# Altium integrated library WCAP-ATET_rev15a.intlib: 72 symbols (continued)
## WCAP-ATET 6.3x11x2.5x0.5 860130673002
designator C?, comment 22 μF
WCAP-ATET Aluminum Electrolytic Capacitors , 22 μF; + / - 20%; 50 V , 6,3 x 11; Manufacturer: Wurth Elektronik; partNo: 860130673002; E-mail: libraries@we-online.com; Characteristics: Aluminum Electrolytic Capacitor; Recommended soldering: Wave; Operating temperature:–40 °C to +125 °C for UR < 250 V, –25 °C to +125 °C for UR ≥ 250 V; High temperature product series; Load life: 1000–2000 h @ +125 °C; ComponentLink1Description: Manufacturer; ComponentLink1URL: http://www.we-online.com; ComponentLink2Description: Datasheet; ComponentLink2URL: http://katalog.we-online.de/pbs/datasheet/860130673002.pdf; Created by: Karrer Zheng; Created Date: 6/8/2015; Capacitance: 22 μF; Application: Used in circuit with rigorous conditions and high ambient temperature;  high voltage type range from 160V-450V used as primary side input filter in power supply. Low voltage type is applied to the secondary side output filtering loop, used in switching power supply with higher operating temperature, DC-DC converter, AC-DC converter, adapter, charger, TV, VCR, DC motor circuit filter, high-end switching power supply, LCD TV, energy saving lamps, electronic ballast, LED lamp and etc.
footprint WCAP-ATET 6.3x11x2.5x0.5
pins: 1, 2

## WCAP-ATET 8x11.5x3.5x0.5 860130674003
designator C?, comment 33 μF
WCAP-ATET Aluminum Electrolytic Capacitors , 33 μF; + / - 20%; 50 V , 8 x 11,5; Manufacturer: Wurth Elektronik; partNo: 860130674003; E-mail: libraries@we-online.com; Characteristics: Aluminum Electrolytic Capacitor; Recommended soldering: Wave; Operating temperature:–40 °C to +125 °C for UR < 250 V, –25 °C to +125 °C for UR ≥ 250 V; High temperature product series; Load life: 1000–2000 h @ +125 °C; ComponentLink1Description: Manufacturer; ComponentLink1URL: http://www.we-online.com; ComponentLink2Description: Datasheet; ComponentLink2URL: http://katalog.we-online.de/pbs/datasheet/860130674003.pdf; Created by: Karrer Zheng; Created Date: 6/8/2015; Capacitance: 33 μF; Application: Used in circuit with rigorous conditions and high ambient temperature;  high voltage type range from 160V-450V used as primary side input filter in power supply. Low voltage type is applied to the secondary side output filtering loop, used in switching power supply with higher operating temperature, DC-DC converter, AC-DC converter, adapter, charger, TV, VCR, DC motor circuit filter, high-end switching power supply, LCD TV, energy saving lamps, electronic ballast, LED lamp and etc.
footprint WCAP-ATET 8x11.5x3.5x0.5
pins: 1, 2

## WCAP-ATET 8x11.5x3.5x0.5 860130674004
designator C?, comment 47 μF
WCAP-ATET Aluminum Electrolytic Capacitors , 47 μF; + / - 20%; 50 V , 8 x 11,5; Manufacturer: Wurth Elektronik; partNo: 860130674004; E-mail: libraries@we-online.com; Characteristics: Aluminum Electrolytic Capacitor; Recommended soldering: Wave; Operating temperature:–40 °C to +125 °C for UR < 250 V, –25 °C to +125 °C for UR ≥ 250 V; High temperature product series; Load life: 1000–2000 h @ +125 °C; ComponentLink1Description: Manufacturer; ComponentLink1URL: http://www.we-online.com; ComponentLink2Description: Datasheet; ComponentLink2URL: http://katalog.we-online.de/pbs/datasheet/860130674004.pdf; Created by: Karrer Zheng; Created Date: 6/8/2015; Capacitance: 47 μF; Application: Used in circuit with rigorous conditions and high ambient temperature;  high voltage type range from 160V-450V used as primary side input filter in power supply. Low voltage type is applied to the secondary side output filtering loop, used in switching power supply with higher operating temperature, DC-DC converter, AC-DC converter, adapter, charger, TV, VCR, DC motor circuit filter, high-end switching power supply, LCD TV, energy saving lamps, electronic ballast, LED lamp and etc.
footprint WCAP-ATET 8x11.5x3.5x0.5
pins: 1, 2

## WCAP-ATET 10x12.5x5x0.6 860130675005
designator C?, comment 47 μF
WCAP-ATET Aluminum Electrolytic Capacitors , 47 μF; + / - 20%; 50 V , 10 x 12,5; Manufacturer: Wurth Elektronik; partNo: 860130675005; E-mail: libraries@we-online.com; Characteristics: Aluminum Electrolytic Capacitor; Recommended soldering: Wave; Operating temperature:–40 °C to +125 °C for UR < 250 V, –25 °C to +125 °C for UR ≥ 250 V; High temperature product series; Load life: 1000–2000 h @ +125 °C; ComponentLink1Description: Manufacturer; ComponentLink1URL: http://www.we-online.com; ComponentLink2Description: Datasheet; ComponentLink2URL: http://katalog.we-online.de/pbs/datasheet/860130675005.pdf; Created by: Karrer Zheng; Created Date: 6/8/2015; Capacitance: 47 μF; Application: Used in circuit with rigorous conditions and high ambient temperature;  high voltage type range from 160V-450V used as primary side input filter in power supply. Low voltage type is applied to the secondary side output filtering loop, used in switching power supply with higher operating temperature, DC-DC converter, AC-DC converter, adapter, charger, TV, VCR, DC motor circuit filter, high-end switching power supply, LCD TV, energy saving lamps, electronic ballast, LED lamp and etc.
footprint WCAP-ATET 10x12.5x5x0.6
pins: 1, 2

## WCAP-ATET 10x16x5x0.6 860130675006
designator C?, comment 100 μF
WCAP-ATET Aluminum Electrolytic Capacitors , 100 μF; + / - 20%; 50 V , 10 x 16; Manufacturer: Wurth Elektronik; partNo: 860130675006; E-mail: libraries@we-online.com; Characteristics: Aluminum Electrolytic Capacitor; Recommended soldering: Wave; Operating temperature:–40 °C to +125 °C for UR < 250 V, –25 °C to +125 °C for UR ≥ 250 V; High temperature product series; Load life: 1000–2000 h @ +125 °C; ComponentLink1Description: Manufacturer; ComponentLink1URL: http://www.we-online.com; ComponentLink2Description: Datasheet; ComponentLink2URL: http://katalog.we-online.de/pbs/datasheet/860130675006.pdf; Created by: Karrer Zheng; Created Date: 6/8/2015; Capacitance: 100 μF; Application: Used in circuit with rigorous conditions and high ambient temperature;  high voltage type range from 160V-450V used as primary side input filter in power supply. Low voltage type is applied to the secondary side output filtering loop, used in switching power supply with higher operating temperature, DC-DC converter, AC-DC converter, adapter, charger, TV, VCR, DC motor circuit filter, high-end switching power supply, LCD TV, energy saving lamps, electronic ballast, LED lamp and etc.
footprint WCAP-ATET 10x16x5x0.6
pins: 1, 2

## WCAP-ATET 10x25x5x0.6 860130675007
designator C?, comment 220 μF
WCAP-ATET Aluminum Electrolytic Capacitors , 220 μF; + / - 20%; 50 V , 10 x 25; Manufacturer: Wurth Elektronik; partNo: 860130675007; E-mail: libraries@we-online.com; Characteristics: Aluminum Electrolytic Capacitor; Recommended soldering: Wave; Operating temperature:–40 °C to +125 °C for UR < 250 V, –25 °C to +125 °C for UR ≥ 250 V; High temperature product series; Load life: 1000–2000 h @ +125 °C; ComponentLink1Description: Manufacturer; ComponentLink1URL: http://www.we-online.com; ComponentLink2Description: Datasheet; ComponentLink2URL: http://katalog.we-online.de/pbs/datasheet/860130675007.pdf; Created by: Karrer Zheng; Created Date: 6/8/2015; Capacitance: 220 μF; Application: Used in circuit with rigorous conditions and high ambient temperature;  high voltage type range from 160V-450V used as primary side input filter in power supply. Low voltage type is applied to the secondary side output filtering loop, used in switching power supply with higher operating temperature, DC-DC converter, AC-DC converter, adapter, charger, TV, VCR, DC motor circuit filter, high-end switching power supply, LCD TV, energy saving lamps, electronic ballast, LED lamp and etc.
footprint WCAP-ATET 10x25x5x0.6
pins: 1, 2

## WCAP-ATET 13x20x5x0.6 860130678008
designator C?, comment 220 μF
WCAP-ATET Aluminum Electrolytic Capacitors , 220 μF; + / - 20%; 50 V , 13 x 20; Manufacturer: Wurth Elektronik; partNo: 860130678008; E-mail: libraries@we-online.com; Characteristics: Aluminum Electrolytic Capacitor; Recommended soldering: Wave; Operating temperature:–40 °C to +125 °C for UR < 250 V, –25 °C to +125 °C for UR ≥ 250 V; High temperature product series; Load life: 1000–2000 h @ +125 °C; ComponentLink1Description: Manufacturer; ComponentLink1URL: http://www.we-online.com; ComponentLink2Description: Datasheet; ComponentLink2URL: http://katalog.we-online.de/pbs/datasheet/860130678008.pdf; Created by: Karrer Zheng; Created Date: 6/8/2015; Capacitance: 220 μF; Application: Used in circuit with rigorous conditions and high ambient temperature;  high voltage type range from 160V-450V used as primary side input filter in power supply. Low voltage type is applied to the secondary side output filtering loop, used in switching power supply with higher operating temperature, DC-DC converter, AC-DC converter, adapter, charger, TV, VCR, DC motor circuit filter, high-end switching power supply, LCD TV, energy saving lamps, electronic ballast, LED lamp and etc.
footprint WCAP-ATET 13x20x5x0.6
pins: 1, 2

## WCAP-ATET 13x20x5x0.6 860130678009
designator C?, comment 330 μF
WCAP-ATET Aluminum Electrolytic Capacitors , 330 μF; + / - 20%; 50 V , 13 x 20; Manufacturer: Wurth Elektronik; partNo: 860130678009; E-mail: libraries@we-online.com; Characteristics: Aluminum Electrolytic Capacitor; Recommended soldering: Wave; Operating temperature:–40 °C to +125 °C for UR < 250 V, –25 °C to +125 °C for UR ≥ 250 V; High temperature product series; Load life: 1000–2000 h @ +125 °C; ComponentLink1Description: Manufacturer; ComponentLink1URL: http://www.we-online.com; ComponentLink2Description: Datasheet; ComponentLink2URL: http://katalog.we-online.de/pbs/datasheet/860130678009.pdf; Created by: Karrer Zheng; Created Date: 6/8/2015; Capacitance: 330 μF; Application: Used in circuit with rigorous conditions and high ambient temperature;  high voltage type range from 160V-450V used as primary side input filter in power supply. Low voltage type is applied to the secondary side output filtering loop, used in switching power supply with higher operating temperature, DC-DC converter, AC-DC converter, adapter, charger, TV, VCR, DC motor circuit filter, high-end switching power supply, LCD TV, energy saving lamps, electronic ballast, LED lamp and etc.
footprint WCAP-ATET 13x20x5x0.6
pins: 1, 2

## WCAP-ATET 13x25x5x0.6 860130678010
designator C?, comment 470 μF
WCAP-ATET Aluminum Electrolytic Capacitors , 470 μF; + / - 20%; 50 V , 13 x 25; Manufacturer: Wurth Elektronik; partNo: 860130678010; E-mail: libraries@we-online.com; Characteristics: Aluminum Electrolytic Capacitor; Recommended soldering: Wave; Operating temperature:–40 °C to +125 °C for UR < 250 V, –25 °C to +125 °C for UR ≥ 250 V; High temperature product series; Load life: 1000–2000 h @ +125 °C; ComponentLink1Description: Manufacturer; ComponentLink1URL: http://www.we-online.com; ComponentLink2Description: Datasheet; ComponentLink2URL: http://katalog.we-online.de/pbs/datasheet/860130678010.pdf; Created by: Karrer Zheng; Created Date: 6/8/2015; Capacitance: 470 μF; Application: Used in circuit with rigorous conditions and high ambient temperature;  high voltage type range from 160V-450V used as primary side input filter in power supply. Low voltage type is applied to the secondary side output filtering loop, used in switching power supply with higher operating temperature, DC-DC converter, AC-DC converter, adapter, charger, TV, VCR, DC motor circuit filter, high-end switching power supply, LCD TV, energy saving lamps, electronic ballast, LED lamp and etc.
footprint WCAP-ATET 13x25x5x0.6
pins: 1, 2


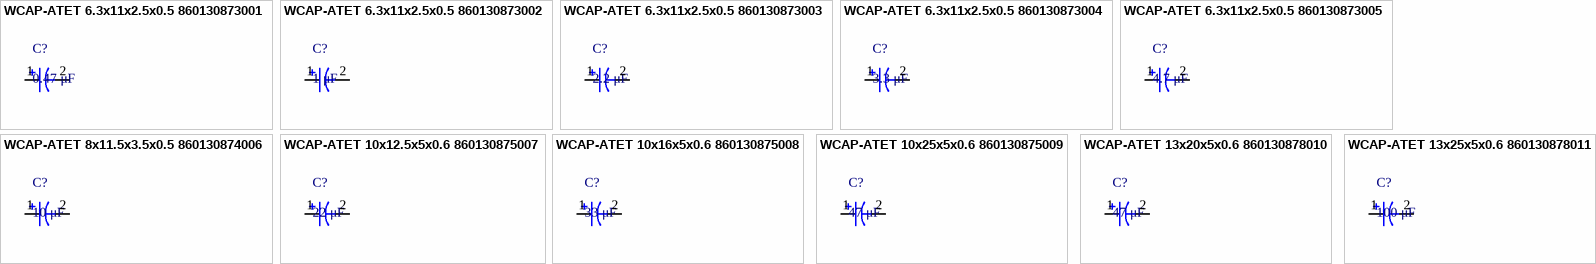
[diagram p5: symbols WCAP-ATET 6.3x11x2.5x0.5 860130873001 to WCAP-ATET 13x25x5x0.6 860130878011]

## WCAP-ATET 6.3x11x2.5x0.5 860130873001
designator C?, comment 0.47 μF
WCAP-ATET Aluminum Electrolytic Capacitors , 0,47 μF; + / - 20%; 100 V , 6,3 x 11; Manufacturer: Wurth Elektronik; partNo: 860130873001; E-mail: libraries@we-online.com; Characteristics: Aluminum Electrolytic Capacitor; Recommended soldering: Wave; Operating temperature:–40 °C to +125 °C for UR < 250 V, –25 °C to +125 °C for UR ≥ 250 V; High temperature product series; Load life: 1000–2000 h @ +125 °C; ComponentLink1Description: Manufacturer; ComponentLink1URL: http://www.we-online.com; ComponentLink2Description: Datasheet; ComponentLink2URL: http://katalog.we-online.de/pbs/datasheet/860130873001.pdf; Created by: Karrer Zheng; Created Date: 6/8/2015; Capacitance: 0.47 μF; Application: Used in circuit with rigorous conditions and high ambient temperature;  high voltage type range from 160V-450V used as primary side input filter in power supply. Low voltage type is applied to the secondary side output filtering loop, used in switching power supply with higher operating temperature, DC-DC converter, AC-DC converter, adapter, charger, TV, VCR, DC motor circuit filter, high-end switching power supply, LCD TV, energy saving lamps, electronic ballast, LED lamp and etc.
footprint WCAP-ATET 6.3x11x2.5x0.5
pins: 1, 2

## WCAP-ATET 6.3x11x2.5x0.5 860130873002
designator C?, comment 1 μF
WCAP-ATET Aluminum Electrolytic Capacitors , 1 μF; + / - 20%; 100 V , 6,3 x 11; Manufacturer: Wurth Elektronik; partNo: 860130873002; E-mail: libraries@we-online.com; Characteristics: Aluminum Electrolytic Capacitor; Recommended soldering: Wave; Operating temperature:–40 °C to +125 °C for UR < 250 V, –25 °C to +125 °C for UR ≥ 250 V; High temperature product series; Load life: 1000–2000 h @ +125 °C; ComponentLink1Description: Manufacturer; ComponentLink1URL: http://www.we-online.com; ComponentLink2Description: Datasheet; ComponentLink2URL: http://katalog.we-online.de/pbs/datasheet/860130873002.pdf; Created by: Karrer Zheng; Created Date: 6/8/2015; Capacitance: 1 μF; Application: Used in circuit with rigorous conditions and high ambient temperature;  high voltage type range from 160V-450V used as primary side input filter in power supply. Low voltage type is applied to the secondary side output filtering loop, used in switching power supply with higher operating temperature, DC-DC converter, AC-DC converter, adapter, charger, TV, VCR, DC motor circuit filter, high-end switching power supply, LCD TV, energy saving lamps, electronic ballast, LED lamp and etc.
footprint WCAP-ATET 6.3x11x2.5x0.5
pins: 1, 2

## WCAP-ATET 6.3x11x2.5x0.5 860130873003
designator C?, comment 2.2 μF
WCAP-ATET Aluminum Electrolytic Capacitors , 2,2 μF; + / - 20%; 100 V , 6,3 x 11; Manufacturer: Wurth Elektronik; partNo: 860130873003; E-mail: libraries@we-online.com; Characteristics: Aluminum Electrolytic Capacitor; Recommended soldering: Wave; Operating temperature:–40 °C to +125 °C for UR < 250 V, –25 °C to +125 °C for UR ≥ 250 V; High temperature product series; Load life: 1000–2000 h @ +125 °C; ComponentLink1Description: Manufacturer; ComponentLink1URL: http://www.we-online.com; ComponentLink2Description: Datasheet; ComponentLink2URL: http://katalog.we-online.de/pbs/datasheet/860130873003.pdf; Created by: Karrer Zheng; Created Date: 6/8/2015; Capacitance: 2.2 μF; Application: Used in circuit with rigorous conditions and high ambient temperature;  high voltage type range from 160V-450V used as primary side input filter in power supply. Low voltage type is applied to the secondary side output filtering loop, used in switching power supply with higher operating temperature, DC-DC converter, AC-DC converter, adapter, charger, TV, VCR, DC motor circuit filter, high-end switching power supply, LCD TV, energy saving lamps, electronic ballast, LED lamp and etc.
footprint WCAP-ATET 6.3x11x2.5x0.5
pins: 1, 2

## WCAP-ATET 6.3x11x2.5x0.5 860130873004
designator C?, comment 3.3 μF
WCAP-ATET Aluminum Electrolytic Capacitors , 3,3 μF; + / - 20%; 100 V , 6,3 x 11; Manufacturer: Wurth Elektronik; partNo: 860130873004; E-mail: libraries@we-online.com; Characteristics: Aluminum Electrolytic Capacitor; Recommended soldering: Wave; Operating temperature:–40 °C to +125 °C for UR < 250 V, –25 °C to +125 °C for UR ≥ 250 V; High temperature product series; Load life: 1000–2000 h @ +125 °C; ComponentLink1Description: Manufacturer; ComponentLink1URL: http://www.we-online.com; ComponentLink2Description: Datasheet; ComponentLink2URL: http://katalog.we-online.de/pbs/datasheet/860130873004.pdf; Created by: Karrer Zheng; Created Date: 6/8/2015; Capacitance: 3.3 μF; Application: Used in circuit with rigorous conditions and high ambient temperature;  high voltage type range from 160V-450V used as primary side input filter in power supply. Low voltage type is applied to the secondary side output filtering loop, used in switching power supply with higher operating temperature, DC-DC converter, AC-DC converter, adapter, charger, TV, VCR, DC motor circuit filter, high-end switching power supply, LCD TV, energy saving lamps, electronic ballast, LED lamp and etc.
footprint WCAP-ATET 6.3x11x2.5x0.5
pins: 1, 2

## WCAP-ATET 6.3x11x2.5x0.5 860130873005
designator C?, comment 4.7 μF
WCAP-ATET Aluminum Electrolytic Capacitors , 4,7 μF; + / - 20%; 100 V , 6,3 x 11; Manufacturer: Wurth Elektronik; partNo: 860130873005; E-mail: libraries@we-online.com; Characteristics: Aluminum Electrolytic Capacitor; Recommended soldering: Wave; Operating temperature:–40 °C to +125 °C for UR < 250 V, –25 °C to +125 °C for UR ≥ 250 V; High temperature product series; Load life: 1000–2000 h @ +125 °C; ComponentLink1Description: Manufacturer; ComponentLink1URL: http://www.we-online.com; ComponentLink2Description: Datasheet; ComponentLink2URL: http://katalog.we-online.de/pbs/datasheet/860130873005.pdf; Created by: Karrer Zheng; Created Date: 6/8/2015; Capacitance: 4.7 μF; Application: Used in circuit with rigorous conditions and high ambient temperature;  high voltage type range from 160V-450V used as primary side input filter in power supply. Low voltage type is applied to the secondary side output filtering loop, used in switching power supply with higher operating temperature, DC-DC converter, AC-DC converter, adapter, charger, TV, VCR, DC motor circuit filter, high-end switching power supply, LCD TV, energy saving lamps, electronic ballast, LED lamp and etc.
footprint WCAP-ATET 6.3x11x2.5x0.5
pins: 1, 2

## WCAP-ATET 8x11.5x3.5x0.5 860130874006
designator C?, comment 10 μF
WCAP-ATET Aluminum Electrolytic Capacitors , 10 μF; + / - 20%; 100 V , 8 x 11,5; Manufacturer: Wurth Elektronik; partNo: 860130874006; E-mail: libraries@we-online.com; Characteristics: Aluminum Electrolytic Capacitor; Recommended soldering: Wave; Operating temperature:–40 °C to +125 °C for UR < 250 V, –25 °C to +125 °C for UR ≥ 250 V; High temperature product series; Load life: 1000–2000 h @ +125 °C; ComponentLink1Description: Manufacturer; ComponentLink1URL: http://www.we-online.com; ComponentLink2Description: Datasheet; ComponentLink2URL: http://katalog.we-online.de/pbs/datasheet/860130874006.pdf; Created by: Karrer Zheng; Created Date: 6/8/2015; Capacitance: 10 μF; Application: Used in circuit with rigorous conditions and high ambient temperature;  high voltage type range from 160V-450V used as primary side input filter in power supply. Low voltage type is applied to the secondary side output filtering loop, used in switching power supply with higher operating temperature, DC-DC converter, AC-DC converter, adapter, charger, TV, VCR, DC motor circuit filter, high-end switching power supply, LCD TV, energy saving lamps, electronic ballast, LED lamp and etc.
footprint WCAP-ATET 8x11.5x3.5x0.5
pins: 1, 2

## WCAP-ATET 10x12.5x5x0.6 860130875007
designator C?, comment 22 μF
WCAP-ATET Aluminum Electrolytic Capacitors , 22 μF; + / - 20%; 100 V , 10 x 12,5; Manufacturer: Wurth Elektronik; partNo: 860130875007; E-mail: libraries@we-online.com; Characteristics: Aluminum Electrolytic Capacitor; Recommended soldering: Wave; Operating temperature:–40 °C to +125 °C for UR < 250 V, –25 °C to +125 °C for UR ≥ 250 V; High temperature product series; Load life: 1000–2000 h @ +125 °C; ComponentLink1Description: Manufacturer; ComponentLink1URL: http://www.we-online.com; ComponentLink2Description: Datasheet; ComponentLink2URL: http://katalog.we-online.de/pbs/datasheet/860130875007.pdf; Created by: Karrer Zheng; Created Date: 6/8/2015; Capacitance: 22 μF; Application: Used in circuit with rigorous conditions and high ambient temperature;  high voltage type range from 160V-450V used as primary side input filter in power supply. Low voltage type is applied to the secondary side output filtering loop, used in switching power supply with higher operating temperature, DC-DC converter, AC-DC converter, adapter, charger, TV, VCR, DC motor circuit filter, high-end switching power supply, LCD TV, energy saving lamps, electronic ballast, LED lamp and etc.
footprint WCAP-ATET 10x12.5x5x0.6
pins: 1, 2

## WCAP-ATET 10x16x5x0.6 860130875008
designator C?, comment 33 μF
WCAP-ATET Aluminum Electrolytic Capacitors , 33 μF; + / - 20%; 100 V , 10 x 16; Manufacturer: Wurth Elektronik; partNo: 860130875008; E-mail: libraries@we-online.com; Characteristics: Aluminum Electrolytic Capacitor; Recommended soldering: Wave; Operating temperature:–40 °C to +125 °C for UR < 250 V, –25 °C to +125 °C for UR ≥ 250 V; High temperature product series; Load life: 1000–2000 h @ +125 °C; ComponentLink1Description: Manufacturer; ComponentLink1URL: http://www.we-online.com; ComponentLink2Description: Datasheet; ComponentLink2URL: http://katalog.we-online.de/pbs/datasheet/860130875008.pdf; Created by: Karrer Zheng; Created Date: 6/8/2015; Capacitance: 33 μF; Application: Used in circuit with rigorous conditions and high ambient temperature;  high voltage type range from 160V-450V used as primary side input filter in power supply. Low voltage type is applied to the secondary side output filtering loop, used in switching power supply with higher operating temperature, DC-DC converter, AC-DC converter, adapter, charger, TV, VCR, DC motor circuit filter, high-end switching power supply, LCD TV, energy saving lamps, electronic ballast, LED lamp and etc.
footprint WCAP-ATET 10x16x5x0.6
pins: 1, 2

## WCAP-ATET 10x25x5x0.6 860130875009
designator C?, comment 47 μF
WCAP-ATET Aluminum Electrolytic Capacitors , 47 μF; + / - 20%; 100 V , 10 x 25; Manufacturer: Wurth Elektronik; partNo: 860130875009; E-mail: libraries@we-online.com; Characteristics: Aluminum Electrolytic Capacitor; Recommended soldering: Wave; Operating temperature:–40 °C to +125 °C for UR < 250 V, –25 °C to +125 °C for UR ≥ 250 V; High temperature product series; Load life: 1000–2000 h @ +125 °C; ComponentLink1Description: Manufacturer; ComponentLink1URL: http://www.we-online.com; ComponentLink2Description: Datasheet; ComponentLink2URL: http://katalog.we-online.de/pbs/datasheet/860130875009.pdf; Created by: Karrer Zheng; Created Date: 6/8/2015; Capacitance: 47 μF; Application: Used in circuit with rigorous conditions and high ambient temperature;  high voltage type range from 160V-450V used as primary side input filter in power supply. Low voltage type is applied to the secondary side output filtering loop, used in switching power supply with higher operating temperature, DC-DC converter, AC-DC converter, adapter, charger, TV, VCR, DC motor circuit filter, high-end switching power supply, LCD TV, energy saving lamps, electronic ballast, LED lamp and etc.
footprint WCAP-ATET 10x25x5x0.6
pins: 1, 2

## WCAP-ATET 13x20x5x0.6 860130878010
designator C?, comment 47 μF
WCAP-ATET Aluminum Electrolytic Capacitors , 47 μF; + / - 20%; 100 V , 13 x 20; Manufacturer: Wurth Elektronik; partNo: 860130878010; E-mail: libraries@we-online.com; Characteristics: Aluminum Electrolytic Capacitor; Recommended soldering: Wave; Operating temperature:–40 °C to +125 °C for UR < 250 V, –25 °C to +125 °C for UR ≥ 250 V; High temperature product series; Load life: 1000–2000 h @ +125 °C; ComponentLink1Description: Manufacturer; ComponentLink1URL: http://www.we-online.com; ComponentLink2Description: Datasheet; ComponentLink2URL: http://katalog.we-online.de/pbs/datasheet/860130878010.pdf; Created by: Karrer Zheng; Created Date: 6/8/2015; Capacitance: 47 μF; Application: Used in circuit with rigorous conditions and high ambient temperature;  high voltage type range from 160V-450V used as primary side input filter in power supply. Low voltage type is applied to the secondary side output filtering loop, used in switching power supply with higher operating temperature, DC-DC converter, AC-DC converter, adapter, charger, TV, VCR, DC motor circuit filter, high-end switching power supply, LCD TV, energy saving lamps, electronic ballast, LED lamp and etc.
footprint WCAP-ATET 13x20x5x0.6
pins: 1, 2

## WCAP-ATET 13x25x5x0.6 860130878011
designator C?, comment 100 μF
WCAP-ATET Aluminum Electrolytic Capacitors , 100 μF; + / - 20%; 100 V , 13 x 25; Manufacturer: Wurth Elektronik; partNo: 860130878011; E-mail: libraries@we-online.com; Characteristics: Aluminum Electrolytic Capacitor; Recommended soldering: Wave; Operating temperature:–40 °C to +125 °C for UR < 250 V, –25 °C to +125 °C for UR ≥ 250 V; High temperature product series; Load life: 1000–2000 h @ +125 °C; ComponentLink1Description: Manufacturer; ComponentLink1URL: http://www.we-online.com; ComponentLink2Description: Datasheet; ComponentLink2URL: http://katalog.we-online.de/pbs/datasheet/860130878011.pdf; Created by: Karrer Zheng; Created Date: 6/8/2015; Capacitance: 100 μF; Application: Used in circuit with rigorous conditions and high ambient temperature;  high voltage type range from 160V-450V used as primary side input filter in power supply. Low voltage type is applied to the secondary side output filtering loop, used in switching power supply with higher operating temperature, DC-DC converter, AC-DC converter, adapter, charger, TV, VCR, DC motor circuit filter, high-end switching power supply, LCD TV, energy saving lamps, electronic ballast, LED lamp and etc.
footprint WCAP-ATET 13x25x5x0.6
pins: 1, 2


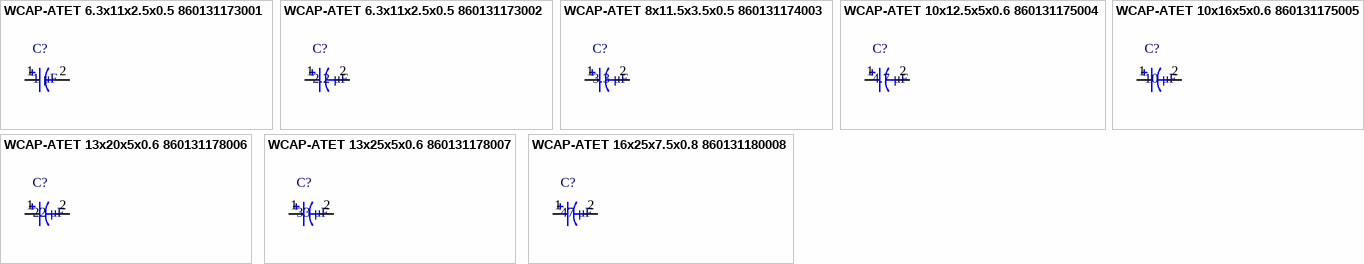
[diagram p6: symbols WCAP-ATET 6.3x11x2.5x0.5 860131173001 to WCAP-ATET 16x25x7.5x0.8 860131180008]

## WCAP-ATET 6.3x11x2.5x0.5 860131173001
designator C?, comment 1 μF
WCAP-ATET Aluminum Electrolytic Capacitors , 1 μF; + / - 20%; 250 V , 6,3 x 11; Manufacturer: Wurth Elektronik; partNo: 860131173001; E-mail: libraries@we-online.com; Characteristics: Aluminum Electrolytic Capacitor; Recommended soldering: Wave; Operating temperature:–40 °C to +125 °C for UR < 250 V, –25 °C to +125 °C for UR ≥ 250 V; High temperature product series; Load life: 1000–2000 h @ +125 °C; ComponentLink1Description: Manufacturer; ComponentLink1URL: http://www.we-online.com; ComponentLink2Description: Datasheet; ComponentLink2URL: http://katalog.we-online.de/pbs/datasheet/860131173001.pdf; Created by: Karrer Zheng; Created Date: 6/8/2015; Capacitance: 1 μF; Application: Used in circuit with rigorous conditions and high ambient temperature;  high voltage type range from 160V-450V used as primary side input filter in power supply. Low voltage type is applied to the secondary side output filtering loop, used in switching power supply with higher operating temperature, DC-DC converter, AC-DC converter, adapter, charger, TV, VCR, DC motor circuit filter, high-end switching power supply, LCD TV, energy saving lamps, electronic ballast, LED lamp and etc.
footprint WCAP-ATET 6.3x11x2.5x0.5
pins: 1, 2

## WCAP-ATET 6.3x11x2.5x0.5 860131173002
designator C?, comment 2.2 μF
WCAP-ATET Aluminum Electrolytic Capacitors , 2,2 μF; + / - 20%; 250 V , 6,3 x 11; Manufacturer: Wurth Elektronik; partNo: 860131173002; E-mail: libraries@we-online.com; Characteristics: Aluminum Electrolytic Capacitor; Recommended soldering: Wave; Operating temperature:–40 °C to +125 °C for UR < 250 V, –25 °C to +125 °C for UR ≥ 250 V; High temperature product series; Load life: 1000–2000 h @ +125 °C; ComponentLink1Description: Manufacturer; ComponentLink1URL: http://www.we-online.com; ComponentLink2Description: Datasheet; ComponentLink2URL: http://katalog.we-online.de/pbs/datasheet/860131173002.pdf; Created by: Karrer Zheng; Created Date: 6/8/2015; Capacitance: 2.2 μF; Application: Used in circuit with rigorous conditions and high ambient temperature;  high voltage type range from 160V-450V used as primary side input filter in power supply. Low voltage type is applied to the secondary side output filtering loop, used in switching power supply with higher operating temperature, DC-DC converter, AC-DC converter, adapter, charger, TV, VCR, DC motor circuit filter, high-end switching power supply, LCD TV, energy saving lamps, electronic ballast, LED lamp and etc.
footprint WCAP-ATET 6.3x11x2.5x0.5
pins: 1, 2

## WCAP-ATET 8x11.5x3.5x0.5 860131174003
designator C?, comment 3.3 μF
WCAP-ATET Aluminum Electrolytic Capacitors , 3,3 μF; + / - 20%; 250 V , 8 x 11,5; Manufacturer: Wurth Elektronik; partNo: 860131174003; E-mail: libraries@we-online.com; Characteristics: Aluminum Electrolytic Capacitor; Recommended soldering: Wave; Operating temperature:–40 °C to +125 °C for UR < 250 V, –25 °C to +125 °C for UR ≥ 250 V; High temperature product series; Load life: 1000–2000 h @ +125 °C; ComponentLink1Description: Manufacturer; ComponentLink1URL: http://www.we-online.com; ComponentLink2Description: Datasheet; ComponentLink2URL: http://katalog.we-online.de/pbs/datasheet/860131174003.pdf; Created by: Karrer Zheng; Created Date: 6/8/2015; Capacitance: 3.3 μF; Application: Used in circuit with rigorous conditions and high ambient temperature;  high voltage type range from 160V-450V used as primary side input filter in power supply. Low voltage type is applied to the secondary side output filtering loop, used in switching power supply with higher operating temperature, DC-DC converter, AC-DC converter, adapter, charger, TV, VCR, DC motor circuit filter, high-end switching power supply, LCD TV, energy saving lamps, electronic ballast, LED lamp and etc.
footprint WCAP-ATET 8x11.5x3.5x0.5
pins: 1, 2

## WCAP-ATET 10x12.5x5x0.6 860131175004
designator C?, comment 4.7 μF
WCAP-ATET Aluminum Electrolytic Capacitors , 4,7 μF; + / - 20%; 250 V , 10 x 12,5; Manufacturer: Wurth Elektronik; partNo: 860131175004; E-mail: libraries@we-online.com; Characteristics: Aluminum Electrolytic Capacitor; Recommended soldering: Wave; Operating temperature:–40 °C to +125 °C for UR < 250 V, –25 °C to +125 °C for UR ≥ 250 V; High temperature product series; Load life: 1000–2000 h @ +125 °C; ComponentLink1Description: Manufacturer; ComponentLink1URL: http://www.we-online.com; ComponentLink2Description: Datasheet; ComponentLink2URL: http://katalog.we-online.de/pbs/datasheet/860131175004.pdf; Created by: Karrer Zheng; Created Date: 6/8/2015; Capacitance: 4.7 μF; Application: Used in circuit with rigorous conditions and high ambient temperature;  high voltage type range from 160V-450V used as primary side input filter in power supply. Low voltage type is applied to the secondary side output filtering loop, used in switching power supply with higher operating temperature, DC-DC converter, AC-DC converter, adapter, charger, TV, VCR, DC motor circuit filter, high-end switching power supply, LCD TV, energy saving lamps, electronic ballast, LED lamp and etc.
footprint WCAP-ATET 10x12.5x5x0.6
pins: 1, 2

## WCAP-ATET 10x16x5x0.6 860131175005
designator C?, comment 10 μF
WCAP-ATET Aluminum Electrolytic Capacitors , 10 μF; + / - 20%; 250 V , 10 x 16; Manufacturer: Wurth Elektronik; partNo: 860131175005; E-mail: libraries@we-online.com; Characteristics: Aluminum Electrolytic Capacitor; Recommended soldering: Wave; Operating temperature:–40 °C to +125 °C for UR < 250 V, –25 °C to +125 °C for UR ≥ 250 V; High temperature product series; Load life: 1000–2000 h @ +125 °C; ComponentLink1Description: Manufacturer; ComponentLink1URL: http://www.we-online.com; ComponentLink2Description: Datasheet; ComponentLink2URL: http://katalog.we-online.de/pbs/datasheet/860131175005.pdf; Created by: Karrer Zheng; Created Date: 6/8/2015; Capacitance: 10 μF; Application: Used in circuit with rigorous conditions and high ambient temperature;  high voltage type range from 160V-450V used as primary side input filter in power supply. Low voltage type is applied to the secondary side output filtering loop, used in switching power supply with higher operating temperature, DC-DC converter, AC-DC converter, adapter, charger, TV, VCR, DC motor circuit filter, high-end switching power supply, LCD TV, energy saving lamps, electronic ballast, LED lamp and etc.
footprint WCAP-ATET 10x16x5x0.6
pins: 1, 2

## WCAP-ATET 13x20x5x0.6 860131178006
designator C?, comment 22 μF
WCAP-ATET Aluminum Electrolytic Capacitors , 22 μF; + / - 20%; 250 V , 13 x 20; Manufacturer: Wurth Elektronik; partNo: 860131178006; E-mail: libraries@we-online.com; Characteristics: Aluminum Electrolytic Capacitor; Recommended soldering: Wave; Operating temperature:–40 °C to +125 °C for UR < 250 V, –25 °C to +125 °C for UR ≥ 250 V; High temperature product series; Load life: 1000–2000 h @ +125 °C; ComponentLink1Description: Manufacturer; ComponentLink1URL: http://www.we-online.com; ComponentLink2Description: Datasheet; ComponentLink2URL: http://katalog.we-online.de/pbs/datasheet/860131178006.pdf; Created by: Karrer Zheng; Created Date: 6/8/2015; Capacitance: 22 μF; Application: Used in circuit with rigorous conditions and high ambient temperature;  high voltage type range from 160V-450V used as primary side input filter in power supply. Low voltage type is applied to the secondary side output filtering loop, used in switching power supply with higher operating temperature, DC-DC converter, AC-DC converter, adapter, charger, TV, VCR, DC motor circuit filter, high-end switching power supply, LCD TV, energy saving lamps, electronic ballast, LED lamp and etc.
footprint WCAP-ATET 13x20x5x0.6
pins: 1, 2

## WCAP-ATET 13x25x5x0.6 860131178007
designator C?, comment 33 μF
WCAP-ATET Aluminum Electrolytic Capacitors , 33 μF; + / - 20%; 250 V , 13 x 25; Manufacturer: Wurth Elektronik; partNo: 860131178007; E-mail: libraries@we-online.com; Characteristics: Aluminum Electrolytic Capacitor; Recommended soldering: Wave; Operating temperature:–40 °C to +125 °C for UR < 250 V, –25 °C to +125 °C for UR ≥ 250 V; High temperature product series; Load life: 1000–2000 h @ +125 °C; ComponentLink1Description: Manufacturer; ComponentLink1URL: http://www.we-online.com; ComponentLink2Description: Datasheet; ComponentLink2URL: http://katalog.we-online.de/pbs/datasheet/860131178007.pdf; Created by: Karrer Zheng; Created Date: 6/8/2015; Capacitance: 33 μF; Application: Used in circuit with rigorous conditions and high ambient temperature;  high voltage type range from 160V-450V used as primary side input filter in power supply. Low voltage type is applied to the secondary side output filtering loop, used in switching power supply with higher operating temperature, DC-DC converter, AC-DC converter, adapter, charger, TV, VCR, DC motor circuit filter, high-end switching power supply, LCD TV, energy saving lamps, electronic ballast, LED lamp and etc.
footprint WCAP-ATET 13x25x5x0.6
pins: 1, 2

## WCAP-ATET 16x25x7.5x0.8 860131180008
designator C?, comment 47 μF
WCAP-ATET Aluminum Electrolytic Capacitors , 47 μF; + / - 20%; 250 V , 16 x 25; Manufacturer: Wurth Elektronik; partNo: 860131180008; E-mail: libraries@we-online.com; Characteristics: Aluminum Electrolytic Capacitor; Recommended soldering: Wave; Operating temperature:–40 °C to +125 °C for UR < 250 V, –25 °C to +125 °C for UR ≥ 250 V; High temperature product series; Load life: 1000–2000 h @ +125 °C; ComponentLink1Description: Manufacturer; ComponentLink1URL: http://www.we-online.com; ComponentLink2Description: Datasheet; ComponentLink2URL: http://katalog.we-online.de/pbs/datasheet/860131180008.pdf; Created by: Karrer Zheng; Created Date: 6/8/2015; Capacitance: 47 μF; Application: Used in circuit with rigorous conditions and high ambient temperature;  high voltage type range from 160V-450V used as primary side input filter in power supply. Low voltage type is applied to the secondary side output filtering loop, used in switching power supply with higher operating temperature, DC-DC converter, AC-DC converter, adapter, charger, TV, VCR, DC motor circuit filter, high-end switching power supply, LCD TV, energy saving lamps, electronic ballast, LED lamp and etc.
footprint WCAP-ATET 16x25x7.5x0.8
pins: 1, 2


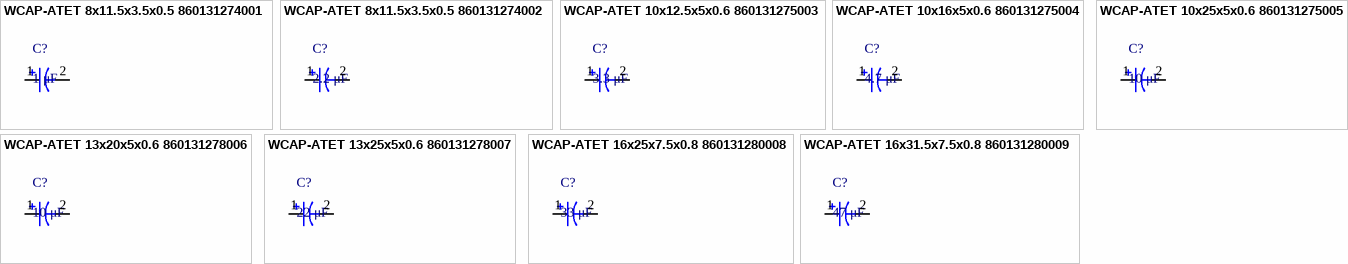
[diagram p7: symbols WCAP-ATET 8x11.5x3.5x0.5 860131274001 to WCAP-ATET 16x31.5x7.5x0.8 860131280009]

## WCAP-ATET 8x11.5x3.5x0.5 860131274001
designator C?, comment 1 μF
WCAP-ATET Aluminum Electrolytic Capacitors , 1 μF; + / - 20%; 350 V , 8 x 11,5; Manufacturer: Wurth Elektronik; partNo: 860131274001; E-mail: libraries@we-online.com; Characteristics: Aluminum Electrolytic Capacitor; Recommended soldering: Wave; Operating temperature:–40 °C to +125 °C for UR < 250 V, –25 °C to +125 °C for UR ≥ 250 V; High temperature product series; Load life: 1000–2000 h @ +125 °C; ComponentLink1Description: Manufacturer; ComponentLink1URL: http://www.we-online.com; ComponentLink2Description: Datasheet; ComponentLink2URL: http://katalog.we-online.de/pbs/datasheet/860131274001.pdf; Created by: Karrer Zheng; Created Date: 6/8/2015; Capacitance: 1 μF; Application: Used in circuit with rigorous conditions and high ambient temperature;  high voltage type range from 160V-450V used as primary side input filter in power supply. Low voltage type is applied to the secondary side output filtering loop, used in switching power supply with higher operating temperature, DC-DC converter, AC-DC converter, adapter, charger, TV, VCR, DC motor circuit filter, high-end switching power supply, LCD TV, energy saving lamps, electronic ballast, LED lamp and etc.
footprint WCAP-ATET 8x11.5x3.5x0.5
pins: 1, 2

## WCAP-ATET 8x11.5x3.5x0.5 860131274002
designator C?, comment 2.2 μF
WCAP-ATET Aluminum Electrolytic Capacitors , 2,2 μF; + / - 20%; 350 V , 8 x 11,5; Manufacturer: Wurth Elektronik; partNo: 860131274002; E-mail: libraries@we-online.com; Characteristics: Aluminum Electrolytic Capacitor; Recommended soldering: Wave; Operating temperature:–40 °C to +125 °C for UR < 250 V, –25 °C to +125 °C for UR ≥ 250 V; High temperature product series; Load life: 1000–2000 h @ +125 °C; ComponentLink1Description: Manufacturer; ComponentLink1URL: http://www.we-online.com; ComponentLink2Description: Datasheet; ComponentLink2URL: http://katalog.we-online.de/pbs/datasheet/860131274002.pdf; Created by: Karrer Zheng; Created Date: 6/8/2015; Capacitance: 2.2 μF; Application: Used in circuit with rigorous conditions and high ambient temperature;  high voltage type range from 160V-450V used as primary side input filter in power supply. Low voltage type is applied to the secondary side output filtering loop, used in switching power supply with higher operating temperature, DC-DC converter, AC-DC converter, adapter, charger, TV, VCR, DC motor circuit filter, high-end switching power supply, LCD TV, energy saving lamps, electronic ballast, LED lamp and etc.
footprint WCAP-ATET 8x11.5x3.5x0.5
pins: 1, 2

## WCAP-ATET 10x12.5x5x0.6 860131275003
designator C?, comment 3.3 μF
WCAP-ATET Aluminum Electrolytic Capacitors , 3,3 μF; + / - 20%; 350 V , 10 x 12,5; Manufacturer: Wurth Elektronik; partNo: 860131275003; E-mail: libraries@we-online.com; Characteristics: Aluminum Electrolytic Capacitor; Recommended soldering: Wave; Operating temperature:–40 °C to +125 °C for UR < 250 V, –25 °C to +125 °C for UR ≥ 250 V; High temperature product series; Load life: 1000–2000 h @ +125 °C; ComponentLink1Description: Manufacturer; ComponentLink1URL: http://www.we-online.com; ComponentLink2Description: Datasheet; ComponentLink2URL: http://katalog.we-online.de/pbs/datasheet/860131275003.pdf; Created by: Karrer Zheng; Created Date: 6/8/2015; Capacitance: 3.3 μF; Application: Used in circuit with rigorous conditions and high ambient temperature;  high voltage type range from 160V-450V used as primary side input filter in power supply. Low voltage type is applied to the secondary side output filtering loop, used in switching power supply with higher operating temperature, DC-DC converter, AC-DC converter, adapter, charger, TV, VCR, DC motor circuit filter, high-end switching power supply, LCD TV, energy saving lamps, electronic ballast, LED lamp and etc.
footprint WCAP-ATET 10x12.5x5x0.6
pins: 1, 2

## WCAP-ATET 10x16x5x0.6 860131275004
designator C?, comment 4.7 μF
WCAP-ATET Aluminum Electrolytic Capacitors , 4,7 μF; + / - 20%; 350 V , 10 x 16; Manufacturer: Wurth Elektronik; partNo: 860131275004; E-mail: libraries@we-online.com; Characteristics: Aluminum Electrolytic Capacitor; Recommended soldering: Wave; Operating temperature:–40 °C to +125 °C for UR < 250 V, –25 °C to +125 °C for UR ≥ 250 V; High temperature product series; Load life: 1000–2000 h @ +125 °C; ComponentLink1Description: Manufacturer; ComponentLink1URL: http://www.we-online.com; ComponentLink2Description: Datasheet; ComponentLink2URL: http://katalog.we-online.de/pbs/datasheet/860131275004.pdf; Created by: Karrer Zheng; Created Date: 6/8/2015; Capacitance: 4.7 μF; Application: Used in circuit with rigorous conditions and high ambient temperature;  high voltage type range from 160V-450V used as primary side input filter in power supply. Low voltage type is applied to the secondary side output filtering loop, used in switching power supply with higher operating temperature, DC-DC converter, AC-DC converter, adapter, charger, TV, VCR, DC motor circuit filter, high-end switching power supply, LCD TV, energy saving lamps, electronic ballast, LED lamp and etc.
footprint WCAP-ATET 10x16x5x0.6
pins: 1, 2

## WCAP-ATET 10x25x5x0.6 860131275005
designator C?, comment 10 μF
WCAP-ATET Aluminum Electrolytic Capacitors , 10 μF; + / - 20%; 350 V , 10 x 25; Manufacturer: Wurth Elektronik; partNo: 860131275005; E-mail: libraries@we-online.com; Characteristics: Aluminum Electrolytic Capacitor; Recommended soldering: Wave; Operating temperature:–40 °C to +125 °C for UR < 250 V, –25 °C to +125 °C for UR ≥ 250 V; High temperature product series; Load life: 1000–2000 h @ +125 °C; ComponentLink1Description: Manufacturer; ComponentLink1URL: http://www.we-online.com; ComponentLink2Description: Datasheet; ComponentLink2URL: http://katalog.we-online.de/pbs/datasheet/860131275005.pdf; Created by: Karrer Zheng; Created Date: 6/8/2015; Capacitance: 10 μF; Application: Used in circuit with rigorous conditions and high ambient temperature;  high voltage type range from 160V-450V used as primary side input filter in power supply. Low voltage type is applied to the secondary side output filtering loop, used in switching power supply with higher operating temperature, DC-DC converter, AC-DC converter, adapter, charger, TV, VCR, DC motor circuit filter, high-end switching power supply, LCD TV, energy saving lamps, electronic ballast, LED lamp and etc.
footprint WCAP-ATET 10x25x5x0.6
pins: 1, 2

## WCAP-ATET 13x20x5x0.6 860131278006
designator C?, comment 10 μF
WCAP-ATET Aluminum Electrolytic Capacitors , 10 μF; + / - 20%; 350 V , 13 x 20; Manufacturer: Wurth Elektronik; partNo: 860131278006; E-mail: libraries@we-online.com; Characteristics: Aluminum Electrolytic Capacitor; Recommended soldering: Wave; Operating temperature:–40 °C to +125 °C for UR < 250 V, –25 °C to +125 °C for UR ≥ 250 V; High temperature product series; Load life: 1000–2000 h @ +125 °C; ComponentLink1Description: Manufacturer; ComponentLink1URL: http://www.we-online.com; ComponentLink2Description: Datasheet; ComponentLink2URL: http://katalog.we-online.de/pbs/datasheet/860131278006.pdf; Created by: Karrer Zheng; Created Date: 6/8/2015; Capacitance: 10 μF; Application: Used in circuit with rigorous conditions and high ambient temperature;  high voltage type range from 160V-450V used as primary side input filter in power supply. Low voltage type is applied to the secondary side output filtering loop, used in switching power supply with higher operating temperature, DC-DC converter, AC-DC converter, adapter, charger, TV, VCR, DC motor circuit filter, high-end switching power supply, LCD TV, energy saving lamps, electronic ballast, LED lamp and etc.
footprint WCAP-ATET 13x20x5x0.6
pins: 1, 2

## WCAP-ATET 13x25x5x0.6 860131278007
designator C?, comment 22 μF
WCAP-ATET Aluminum Electrolytic Capacitors , 22 μF; + / - 20%; 350 V , 13 x 25; Manufacturer: Wurth Elektronik; partNo: 860131278007; E-mail: libraries@we-online.com; Characteristics: Aluminum Electrolytic Capacitor; Recommended soldering: Wave; Operating temperature:–40 °C to +125 °C for UR < 250 V, –25 °C to +125 °C for UR ≥ 250 V; High temperature product series; Load life: 1000–2000 h @ +125 °C; ComponentLink1Description: Manufacturer; ComponentLink1URL: http://www.we-online.com; ComponentLink2Description: Datasheet; ComponentLink2URL: http://katalog.we-online.de/pbs/datasheet/860131278007.pdf; Created by: Karrer Zheng; Created Date: 6/8/2015; Capacitance: 22 μF; Application: Used in circuit with rigorous conditions and high ambient temperature;  high voltage type range from 160V-450V used as primary side input filter in power supply. Low voltage type is applied to the secondary side output filtering loop, used in switching power supply with higher operating temperature, DC-DC converter, AC-DC converter, adapter, charger, TV, VCR, DC motor circuit filter, high-end switching power supply, LCD TV, energy saving lamps, electronic ballast, LED lamp and etc.
footprint WCAP-ATET 13x25x5x0.6
pins: 1, 2

## WCAP-ATET 16x25x7.5x0.8 860131280008
designator C?, comment 33 μF
WCAP-ATET Aluminum Electrolytic Capacitors , 33 μF; + / - 20%; 350 V , 16 x 25; Manufacturer: Wurth Elektronik; partNo: 860131280008; E-mail: libraries@we-online.com; Characteristics: Aluminum Electrolytic Capacitor; Recommended soldering: Wave; Operating temperature:–40 °C to +125 °C for UR < 250 V, –25 °C to +125 °C for UR ≥ 250 V; High temperature product series; Load life: 1000–2000 h @ +125 °C; ComponentLink1Description: Manufacturer; ComponentLink1URL: http://www.we-online.com; ComponentLink2Description: Datasheet; ComponentLink2URL: http://katalog.we-online.de/pbs/datasheet/860131280008.pdf; Created by: Karrer Zheng; Created Date: 6/8/2015; Capacitance: 33 μF; Application: Used in circuit with rigorous conditions and high ambient temperature;  high voltage type range from 160V-450V used as primary side input filter in power supply. Low voltage type is applied to the secondary side output filtering loop, used in switching power supply with higher operating temperature, DC-DC converter, AC-DC converter, adapter, charger, TV, VCR, DC motor circuit filter, high-end switching power supply, LCD TV, energy saving lamps, electronic ballast, LED lamp and etc.
footprint WCAP-ATET 16x25x7.5x0.8
pins: 1, 2

## WCAP-ATET 16x31.5x7.5x0.8 860131280009
designator C?, comment 47 μF
WCAP-ATET Aluminum Electrolytic Capacitors , 47 μF; + / - 20%; 350 V , 16 x 31,5; Manufacturer: Wurth Elektronik; partNo: 860131280009; E-mail: libraries@we-online.com; Characteristics: Aluminum Electrolytic Capacitor; Recommended soldering: Wave; Operating temperature:–40 °C to +125 °C for UR < 250 V, –25 °C to +125 °C for UR ≥ 250 V; High temperature product series; Load life: 1000–2000 h @ +125 °C; ComponentLink1Description: Manufacturer; ComponentLink1URL: http://www.we-online.com; ComponentLink2Description: Datasheet; ComponentLink2URL: http://katalog.we-online.de/pbs/datasheet/860131280009.pdf; Created by: Karrer Zheng; Created Date: 6/8/2015; Capacitance: 47 μF; Application: Used in circuit with rigorous conditions and high ambient temperature;  high voltage type range from 160V-450V used as primary side input filter in power supply. Low voltage type is applied to the secondary side output filtering loop, used in switching power supply with higher operating temperature, DC-DC converter, AC-DC converter, adapter, charger, TV, VCR, DC motor circuit filter, high-end switching power supply, LCD TV, energy saving lamps, electronic ballast, LED lamp and etc.
footprint WCAP-ATET 16x31.5x7.5x0.8
pins: 1, 2